# Altium footprint library DipComponent.PcbLib: 303 footprints (part 17 of 19)
Each footprint in its own frame and in the unit in brackets; x right, y up, seen from the top. Pads: shape width x height; smd on the part's side, far side on the other; paste and mask are expansions set on the pad; w line width, h text height; cw(c..) or ccw(c..) is an arc to the next point about the centre after c.
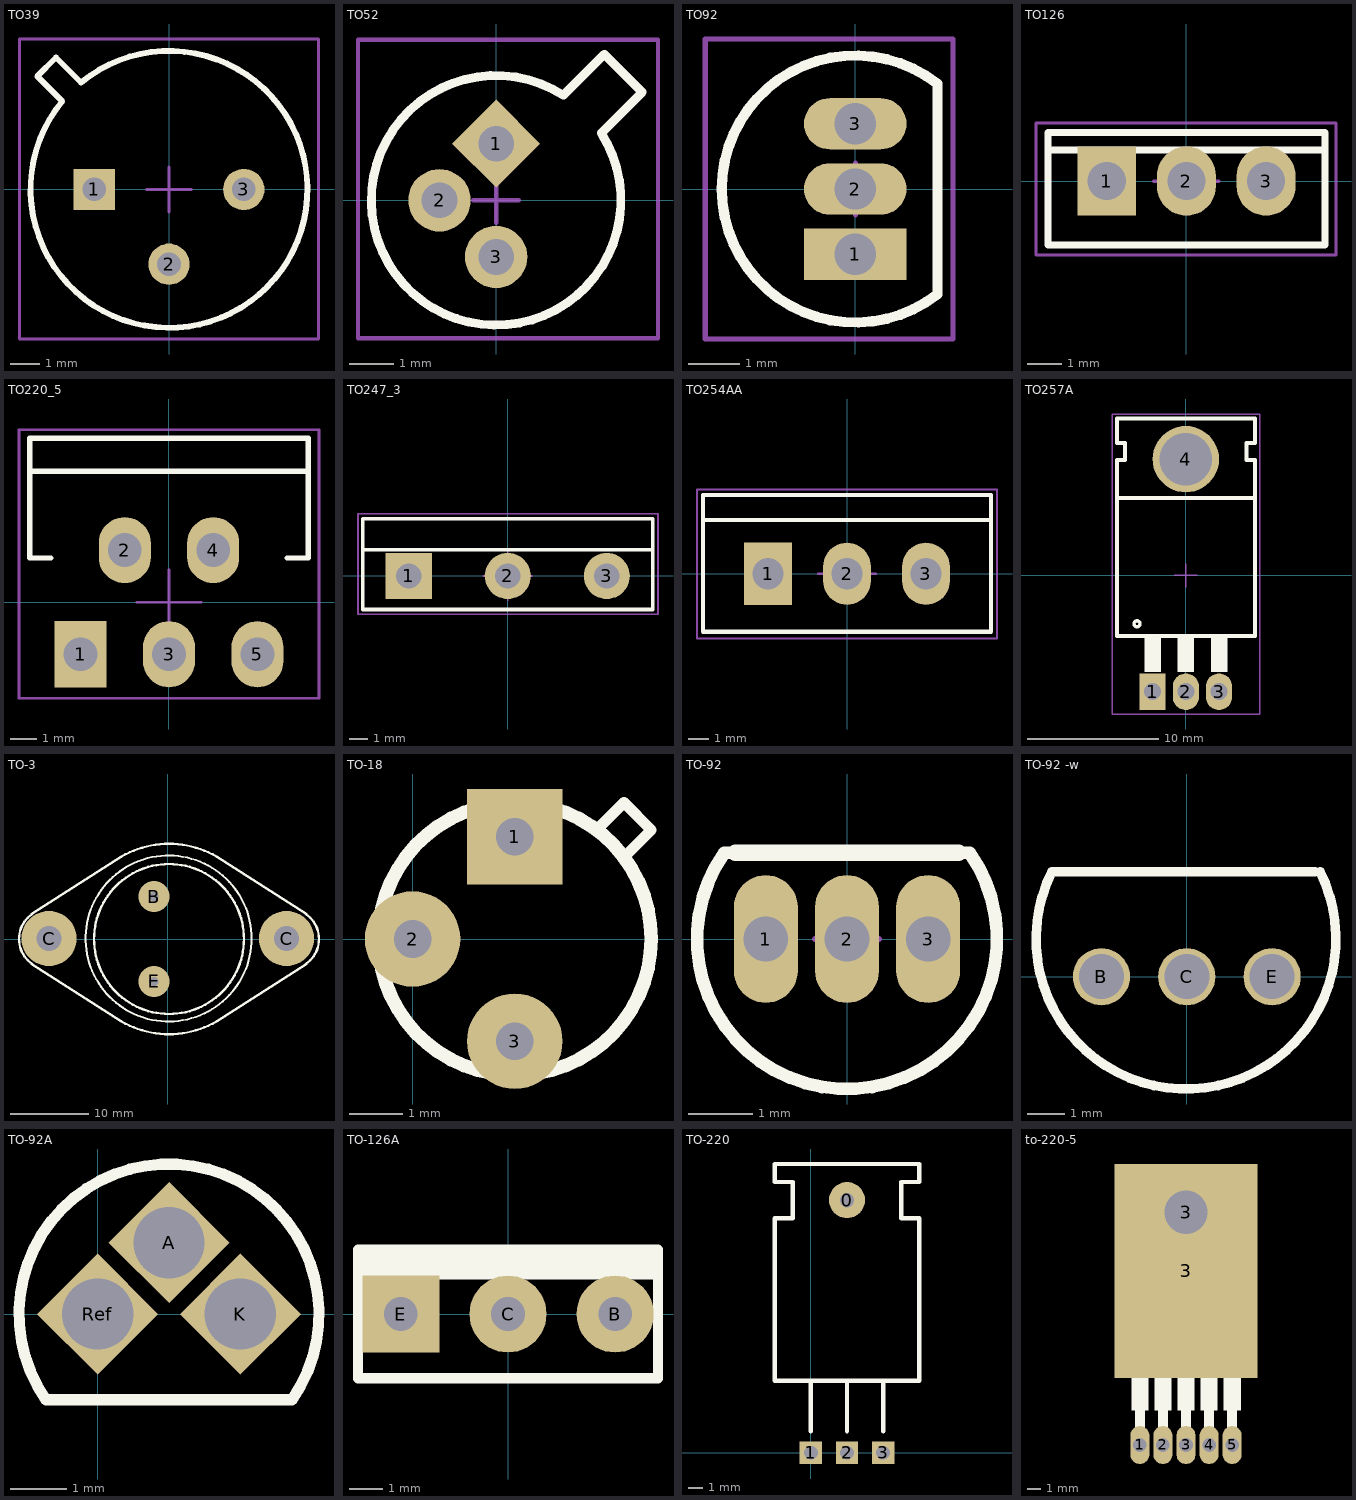
[diagram p16: the footprints below, top view; thin cyan lines are the x and y axes]

## TO39 [mm] "Can; 3 Leads; Pin Circle Dia. 5.08 mm; Lead Dia. 0.48 mm (max)"
height 4.55
pads (3):
  rect 1.4x1.4 hole 0.8: 1(-2.54,0)
  round 1.4 hole 0.8: 2(0,-2.54) 3(2.54,0)
Top Overlay:
  lines w0.2: -4.475,3.838 -3.838,4.475 -2.99,3.626 cw(c0,0) -3.626,2.99 -4.475,3.838
Mechanical 13:
  lines w0.1: -4.475,3.838 -3.626,2.99 ccw(c0,0) -2.99,3.626 -3.838,4.475 -4.475,3.838
Mechanical 15:
  lines w0.1: -0.762,0 0,0 ; 0,-0.762 0,0 ; 0,0.762 0,0 ; 0.762,0 0,0 ; -5.08,-5.08 5.08,-5.08 5.08,5.105 -5.08,5.105 -5.08,-5.08
3D body: height 4.55, standoff 0, extent -4.702,-4.712 4.7,4.705

## TO52 [mm] "Can; 3 Leads; Pin Circle Dia. 2.54 mm; Lead Dia. 0.48 mm (max)"
height 4.04
pads (3):
  rect 1.4x1.4 hole 0.8 rot 135: 1(0,1.27)
  round 1.4 hole 0.8: 2(-1.27,0) 3(0,-1.27)
Top Overlay:
  lines w0.2: 1.51,2.358 ccw(c0,0) 2.358,1.51 3.277,2.429 2.429,3.277 1.51,2.358
Mechanical 13:
  lines w0.1: 1.51,2.358 ccw(c0,0) 2.358,1.51 3.277,2.429 2.429,3.277 1.51,2.358
Mechanical 15:
  lines w0.1: -0.508,0 0,0 ; 0,-0.508 0,0 ; 0,0.508 0,0 ; 0.508,0 0,0 ; -3.099,-3.099 3.632,-3.099 3.632,3.607 -3.099,3.607 -3.099,-3.099
3D body: height 4.04, standoff 0, extent -2.813,-2.801 3.278,3.278

## TO92 [mm] "TO, Flat Index; 3 In-Line, Axial Leads; Body Dia. 5.1mm; Leads 0.48 x 0.48 mm (max)"
height 5.33
pads (3):
  rect 2x1 hole 0.8: 1(0,-1.27)
  oval 2x1 hole 0.8: 2(0,0) 3(0,1.27)
Top Overlay:
  lines w0.2: 1.601,-2.049 cw(c0,0) 1.601,2.049 1.6,-2.049
Mechanical 13:
  lines w0.1: 1.601,-2.049 cw(c0,0) 1.601,2.049 1.6,-2.049
Mechanical 15:
  lines w0.1: -0.508,0 0.508,0 ; 0.002,-0.509 0.002,0.507 ; -2.921,-2.921 1.905,-2.921 1.905,2.921 -2.921,2.921 -2.921,-2.921
3D body "SW3dPS-TO-92A.STEP": height 8, standoff -3, extent -2.355,-2.387 1.575,2.413

## TO126 [mm] "SIP with Mounting Hole; 3 Leads; Body 10.7 x 7.6 x 2.6 mm (typ); Pitch 2.2 mm"
height 13.4
pads (3):
  rect 1.7x2 hole 1.1: 1(-2.3,0)
  oval 1.7x2 hole 1.1: 2(0,0) 3(2.3,0)
Top Overlay:
  lines w0.2: -4,0.9 4,0.9 ; -4,-1.85 -4,1.4 4,1.4 4,-1.85 -4,-1.85
Mechanical 15:
  lines w0.1: -0.94,0 0,0 ; 0,-0.94 0,0 ; 0,0.94 0,0 ; 0.94,0 0,0 ; -4.343,-2.134 -4.343,1.676 4.318,1.676 4.318,-2.134 -4.343,-2.134
3D body: height 11, standoff 2.5, extent -3.999,0.901 3.999,1.399
3D body: height 11, standoff 2.5, extent -3.999,-1.849 3.999,0.899

## TO220_5 [mm] "TO, Thru-Hole, Vertical, Heatsink Mounted; 5 In-Line Leads; Pitch 1.7mm"
height 19
pads (5):
  rect 2x2.54 hole 1.3: 1(-3.4,-2)
  oval 2x2.54 hole 1.3: 2(-1.7,2) 3(0,-2) 4(1.7,2) 5(3.4,-2)
Top Overlay:
  lines w0.2: -5.35,5.03 5.35,5.03 ; -4.537,1.7 -5.35,1.7 -5.35,6.3 5.35,6.3 5.35,1.7 4.531,1.7
Mechanical 15:
  lines w0.1: -1.245,0 0,0 ; 0,-1.245 0,0 ; 0,1.245 0,0 ; 1.245,0 0,0 ; -5.766,-3.69 -5.766,6.625 5.766,6.625 5.766,-3.69 -5.766,-3.69
3D body "SW3dPS-TO220-5.STEP": height 21.59, standoff -2.4, extent -5.08,-2.119 5.08,6.121

## TO247_3 [mm] "SIP with Mounting Hole; 3 Leads; Body 20.6 x 15.6 x 4.7 mm (typ); Pitch 5.56 mm"
height 24.8
pads (3):
  rect 2.54x2.54 hole 1.4: 1(-5.46,0)
  round 2.54 hole 1.4: 2(0,0) 3(5.46,0)
Top Overlay:
  lines w0.2: -8,1.45 8,1.45 ; -8,-1.85 -8,3.15 8,3.15 8,-1.85 -8,-1.85
Mechanical 13:
  lines w0.1: -8,1.45 8,1.45 ; -8,-1.85 8,-1.85 8,3.15 -8,3.15 -8,-1.85
Mechanical 15:
  lines w0.1: 0,-1.346 0,0 ; 0,1.346 0,0 ; 1.346,0 0,0 ; -1.346,0 -1.346,0 ; -1.346,0 0,0 ; -8.255,-2.108 -8.255,3.429 8.28,3.429 8.28,-2.108 -8.255,-2.108
3D body: height 21.5, standoff 5, extent -7.999,-1.849 7.999,3.15
3D body: height 21, standoff 6, extent -7.999,1.451 7.999,3.149

## TO254AA [mm] "TO, Thru-Hole, Vertical, Heatsink Mounted; 3 In-Line Leads; Pitch 3.81 mm"
height 20.3
pads (3):
  rect 2.3x3 hole 1.5: 1(-3.81,0)
  oval 2.3x3 hole 1.5: 2(0,0) 3(3.81,0)
Top Overlay:
  lines w0.2: -6.95,2.6 6.95,2.6 ; -6.95,-2.8 -6.95,3.8 6.95,3.8 6.95,-2.8 -6.95,-2.8
Mechanical 15:
  lines w0.1: -1.397,0 0,0 ; 0,-1.397 0,0 ; 0,1.397 0,0 ; 1.397,0 0,0 ; -7.239,-3.124 -7.239,4.064 7.239,4.064 7.239,-3.124 -7.239,-3.124
3D body: height 20.15, standoff 13.7, extent -6.949,2.601 6.949,3.799
3D body: height 13.7, standoff 1, extent -6.949,-2.799 6.949,3.759

## TO257A [mm] "TO, Thru-Hole,Horizantal; 3 In-Line Leads; Pitch 2.54 mm"
height 0.114
pads (4):
  rect 2x2.794 hole 1.3: 1(-2.54,-8.89)
  oval 2x2.794 hole 1.3: 2(0,-8.89) 3(2.54,-8.89)
  round 5.08 hole 4: 4(0,8.89)
Top Overlay:
  circle w0.254: c-3.734,-3.697 r0.227
  region: 3.175,-4.623 1.905,-4.623 1.905,-7.391 3.175,-7.391
  region: -1.905,-4.623 -3.175,-4.623 -3.175,-7.366 -1.905,-7.366
  region: 0.635,-4.623 -0.635,-4.623 -0.635,-7.366 0.635,-7.366
  lines w0.305: -5.271,5.918 5.08,5.918 ; -5.271,-4.623 -5.271,8.839 -4.635,8.839 -4.635,10.109 -5.271,10.109 -5.271,12.014 5.271,12.014 5.271,10.109 4.635,10.109 4.635,8.839 5.271,8.839 5.271,-4.623 -5.271,-4.623
Mechanical 13:
  lines w0.1: -5.271,5.918 5.271,5.918 ; -5.271,-4.623 5.271,-4.623 5.271,8.839 4.635,8.839 4.635,10.109 5.271,10.109 5.271,12.014 -5.271,12.014 -5.271,10.109 -4.635,10.109 -4.635,8.839 -5.271,8.839 -5.271,-4.623
Mechanical 15:
  lines w0.1: -0.889,0 0,0 ; 0,-0.889 0,0 ; 0,0.889 0,0 ; 0.889,0 0,0 ; -5.639,-10.592 5.664,-10.592 5.664,12.344 -5.639,12.344 -5.639,-10.592
3D body: height 1, standoff 0, extent -5.27,5.919 5.27,12.014
3D body: height 4.9, standoff 0, extent -5.27,-4.622 5.27,5.918
3D body: height 5, standoff 4.8, extent -3.96,-3.923 -3.507,-3.47

## TO-3 [mm]
pads (4):
  round 4 hole 1.2: B(-1.746,5.397) E(-1.746,-5.397)
  round 7 hole 3.2: C(-15.081,0.064) C(15.081,0.064)
Top Overlay:
  circle w0.254: c15.081,0.064 r2.413
  circle w0.305: c0.159,0 r9.525
  circle w0.254: c-15.081,0.064 r2.413
  circle w0.254: c0.108,0.064 r10.541
  lines w0.305: -17.304,-3.175 -5.874,-10.477 ; -17.304,3.175 -5.874,10.477 ; -17.267,-3.121 cw(c-15.081,0) -18.891,0 cw(c-15.081,0) -17.267,3.121 ; -5.886,-10.47 ccw(c0.159,0) 0.159,-12.09 ccw(c0.159,0) 6.204,-10.47 ; -5.886,10.47 cw(c0.159,0) 0.159,12.09 cw(c0.159,0) 6.204,10.47 ; 6.191,-10.477 17.621,-3.175 ; 6.191,10.477 17.621,3.175 ; 17.584,-3.121 ccw(c15.399,0) 19.209,0 ccw(c15.399,0) 17.584,3.121 ; -16.034,-0.318 -15.399,-0.318 -15.399,-0.953 -14.764,-0.953 -14.764,-0.318 -14.129,-0.318 -14.129,0.318 -14.764,0.318 -14.764,0.953 -15.399,0.953 -15.399,0.318 -16.034,0.318 -16.034,-0.318 ; 14.129,-0.318 14.764,-0.318 14.764,-0.953 15.399,-0.953 15.399,-0.318 16.034,-0.318 16.034,0.318 15.399,0.318 15.399,0.953 14.764,0.953 14.764,0.318 14.129,0.318 14.129,-0.318

## TO-18 [mil]
pads (3):
  rect 70x70 hole 27.56: 1(75,75)
  round 70 hole 27.56: 2(0,0) 3(75,-75)
Top Overlay:
  circle w10: c75,0 r100
  lines w8: 135,80 155,100 175,80 155,60
3D body "TO-18.STEP": height 205.33, standoff 0.6, extent -44.85,-119.25 198.59,122.14

## TO-92 [mm] "TO, Flat Index; 3 In-Line, Axial Leads; Body Dia. 4.6mm; Leads 0.41 x 0.39 mm (max)"
height 4.7
pads (3):
  oval 1x2 hole 0.7: 1(-1.27,0) 2(0,0) 3(1.27,0)
Top Overlay:
  lines w0.2: -1.75,1.35 -1.92,1.35 ccw(c0,0) 1.92,1.35 1.75,1.35
  lines w0.254: 1.75,1.35 -1.75,1.35 ; -1.75,1.35 -1.75,1.35
Mechanical 15:
  lines w0.1: -0.5,0 0.5,0 ; 0,-0.5 0,0.5
3D body "User Library-TO-92-4.STEP": height 0.2, standoff -9.83, extent -2.852,-2.655 2.888,1.53

## TO-92 -w [mil] "npn transistoor"
pads (3):
  round 60 hole 47.24: B(-89.61,0) C(0,0) E(89.61,0)
Top Overlay:
  lines w10: -141.71,110 ccw(c-0.85,39.57) 140,110 ; -140.59,110 135,110
3D body "User Library-TO-92C.step": height 314.96, standoff -118.98, extent -109.74,-95 109.74,59.72

## TO-92A [mil]
pads (3):
  rect 60x60 hole 50 rot 45: A(50,50) K(100,0) Ref(0,0)
Top Overlay:
  lines w7.87: -36.27,-59.85 cw(c50,0) 136.22,-59.92 ; -36,-60 136,-60

## TO-126A [mil]
pads (3):
  round 90 hole 39.37: B(125,0) C(0,0)
  rect 90x90 hole 39.37: E(-125,0)
Top Overlay:
  rectangle: -175,40 175,75
  lines w12: -175,-75 175,-75 175,75 -175,75 -175,-75

## TO-220 [mil]
pads (4):
  round 100 hole 40: 0(100,700)
  rect 62x62 hole 38: 1(0,0) 2(100,0) 3(200,0)
Top Overlay:
  lines w12: 0,60 0,200 ; 100,60 100,200 ; 200,60 200,200 ; -100,200 -100,650 -50,650 -50,750 -100,750 -100,800 300,800 300,750 250,750 250,650 300,650 300,200 -100,200

## to-220-5 [mm]
pads (7):
  oval 1.4x2.8 hole 1: 1(-266.976,-24.841) 2(-265.276,-24.841) 3(-263.576,-24.841) 4(-261.876,-24.841) 5(-260.176,-24.841)
  rect 10.541x15.748 smd: 3(-263.576,-12.014)
  round 5 hole 3.2: 3(-263.576,-7.696)
Top Overlay:
  circle w0.305: c-263.576,-7.696 r1.905
  rectangle: -264.213,-22.304 -262.943,-19.764
  rectangle: -260.808,-22.299 -259.538,-19.759
  rectangle: -262.508,-22.304 -261.238,-19.764
  rectangle: -265.908,-22.304 -264.638,-19.764
  rectangle: -267.608,-22.299 -266.338,-19.759
  lines w0.305: -268.576,-10.871 -258.576,-10.871 ; -268.576,-19.761 -268.576,-7.696 -267.941,-7.696 -267.941,-6.426 -268.576,-6.426 -268.576,-4.521 -258.576,-4.521 -258.576,-6.426 -259.211,-6.426 -259.211,-7.696 -258.576,-7.696 -258.576,-19.761 -268.576,-19.761
  lines w0.75: -266.976,-24.841 -266.976,-22.301 ; -265.276,-24.841 -265.276,-22.301 ; -263.576,-24.841 -263.576,-22.301 ; -261.876,-24.841 -261.876,-22.301 ; -260.176,-24.841 -260.176,-22.301